# Altium footprint library kalios.PcbLib: 404 footprints (part 20 of 26)
Each footprint in its own frame and in the unit in brackets; x right, y up, seen from the top. Pads: shape width x height; smd on the part's side, far side on the other; paste and mask are expansions set on the pad; w line width, h text height; cw(c..) or ccw(c..) is an arc to the next point about the centre after c.
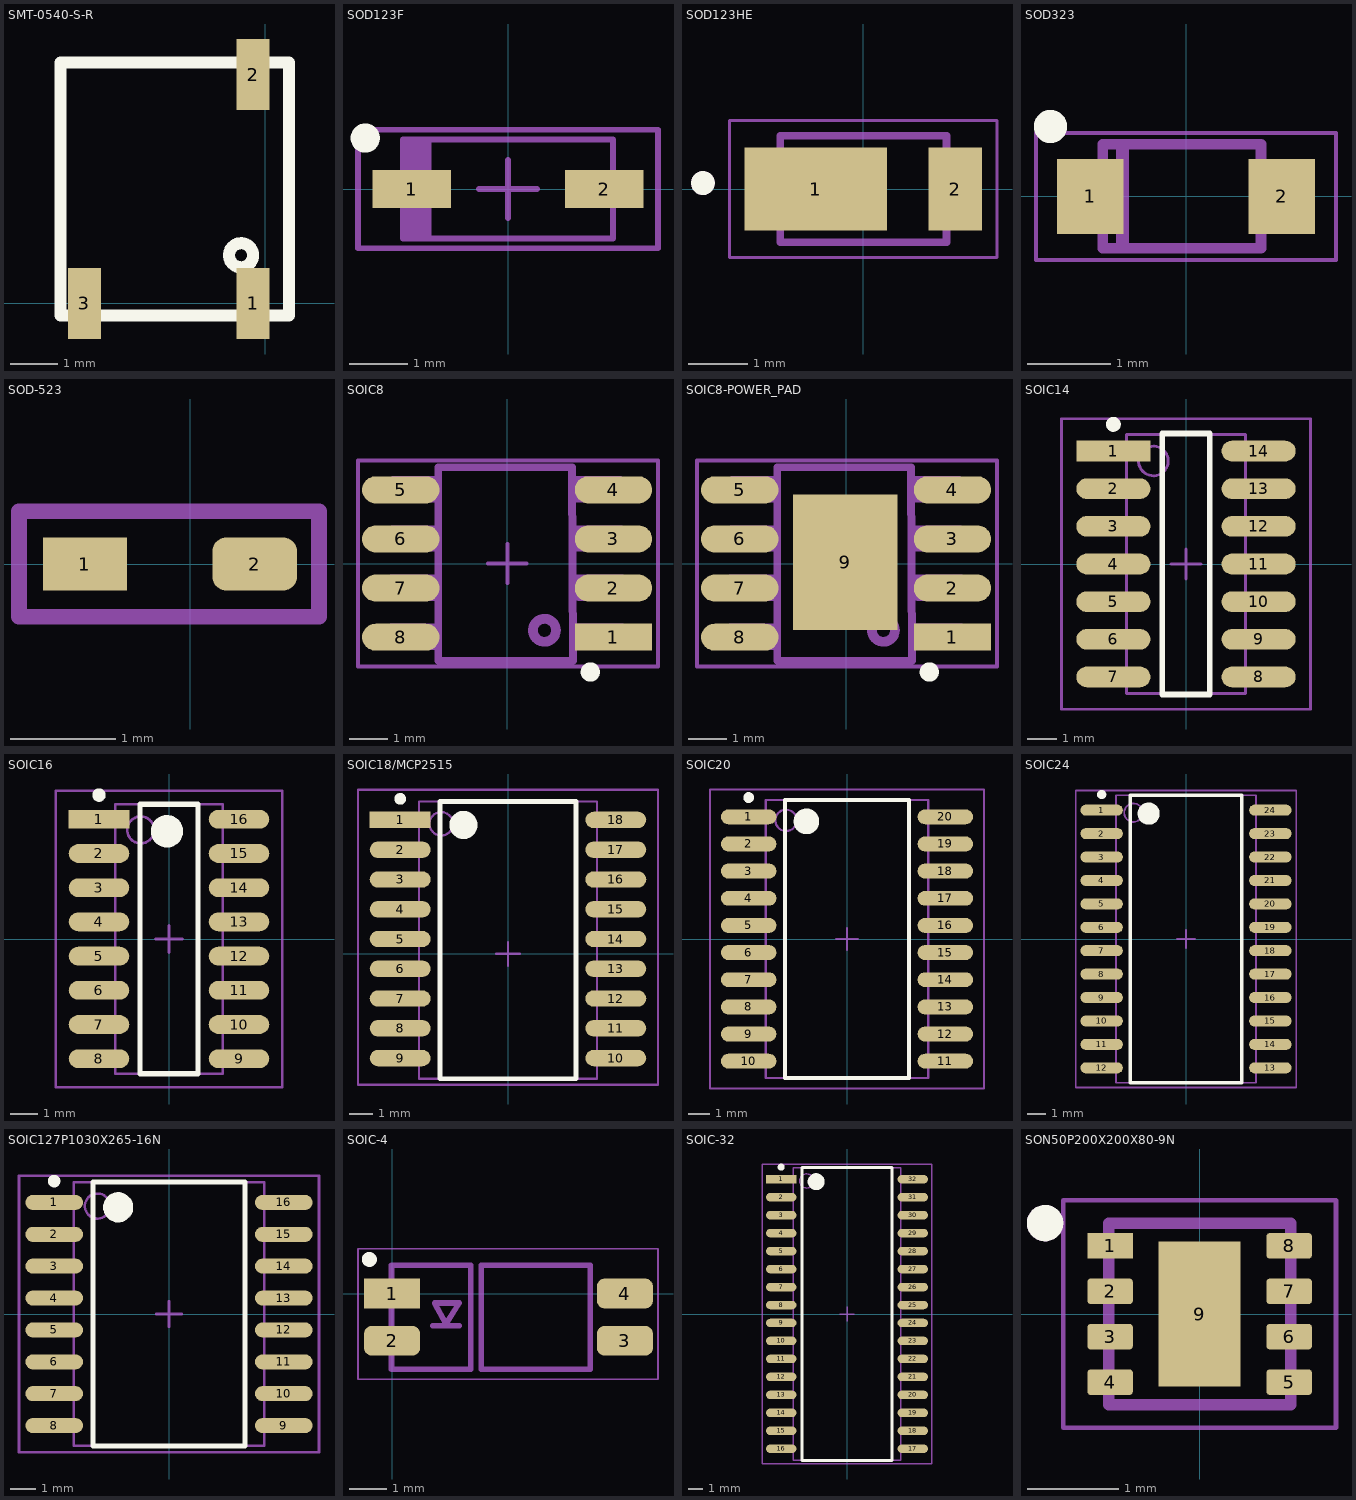
[diagram p19: the footprints below, top view; thin cyan lines are the x and y axes]

## SMT-0540-S-R [mm]
height 2.5
pads (3):
  rect 0.7x1.5 smd: 1(-0.254,0) 2(-0.254,4.826) 3(-3.81,0)
Top Overlay:
  circle w0.254: c-0.508,1.016 r0.254
  lines w0.254: -4.318,-0.254 0.508,-0.254 0.508,5.08 -4.318,5.08 -4.318,-0.254
Top Designator:
  text ".Designator" at -9.523,1.905 h1.52
3D body "SMT-0540-S-R.STEP": height 2, standoff 0, extent -4.38,-0.33 0.62,5.17

## SOD123F [mm] "Molded Diode, 2-Leads, Body 3.5x1.6mm, IPC Medium Density"
height 1.2
pads (2):
  rect 1.35x0.65 smd: 1(-1.65,0) 2(1.65,0)
Top Overlay:
  circle w0.25: c-2.45,0.875 r0.125
Top 3D Body:
  rectangle: -1.8,-0.85 -1.316,0.85
  lines w0.1: -1.8,-0.85 1.8,-0.85 1.8,0.85 -1.8,0.85 -1.8,-0.85
Top Courtyard:
  lines w0.1: -0.5,0 0.5,0 ; 0,-0.5 0,0.5 ; -2.575,-1.016 2.575,-1.016 2.575,1.016 -2.575,1.016 -2.575,-1.016
Top Designator:
  text ".Designator" at -3.536,-0.233 h0.7
3D body "SOD123F.STEP": height 1.27, standoff 0, extent -1.876,-0.8 1.824,0.8

## SOD123HE [mm]
pads (2):
  rect 2.4x1.4 smd: 1(-0.8,0)
  rect 0.9x1.4 smd: 2(1.55,0)
Top Overlay:
  circle w0.2: c-2.7,0.1 r0.1
Top 3D Body:
  circle w0.2: c-2.7,0.1 r0.1
  lines w0.127: -1.4,-0.9 -1.4,0.9 1.4,0.9 1.4,-0.9 -1.4,-0.9
Top Courtyard:
  lines w0.05: -2.25,-1.15 -2.25,1.15 2.25,1.15 2.25,-1.15 -2.25,-1.15
3D body "step_temp.STEP": height 0.85, standoff 0, extent -1.85,-0.9 1.85,0.9

## SOD323 [mm]
pads (2):
  rect 0.8x0.9 smd: 1(-1.15,0) 2(1.15,0)
Top Overlay:
  circle w0.2: c-1.626,0.838 r0.1
Top 3D Body:
  lines w0.127: -1,-0.625 -1,0.625 0.9,0.625 0.9,-0.625 -1,-0.625
  lines w0.152: -0.762,-0.61 -0.762,0.584
Top Courtyard:
  lines w0.05: -1.8,-0.762 1.8,-0.762 1.8,0.762 -1.8,0.762 -1.8,-0.762
Top Designator:
  text ".Designator" at -2.737,-0.167 h0.5
3D body "User Library-SOD323F-1.step": height 1, standoff 0, extent -1.25,-0.675 1.25,0.675

## SOD-523 [mm]
pads (2):
  rect 0.8x0.5 smd: 1(-1,0)
  rrect50% 0.8x0.5 smd: 2(0.61,0)
Top Dimensions:
  lines w0.15: -1.626,-0.5 1.219,-0.5 1.219,0.5 -1.626,0.5 -1.626,0.074 -1.626,-0.5
Top Designator:
  text ".Designator" at -7.821,-0.508 h1.52
3D body "SOD-523.STEP": height 0.71, standoff 0, extent -1.029,-0.457 0.673,0.432

## SOIC8 [mm] "8-Pin Small Outline Integrated Circuit 1.27 mm Pitch, IPC Low Density"
height 1.75
pads (8):
  rect 2x0.7 smd: 1(2.749,-1.905)
  oval 2x0.7 smd: 2(2.749,-0.635) 3(2.749,0.635) 4(2.749,1.905) 5(-2.749,1.905) 6(-2.749,0.635) 7(-2.749,-0.635) 8(-2.749,-1.905)
Top Overlay:
  circle w0.25: c2.151,-2.805 r0.125
Top 3D Body:
  circle w0.254: c0.965,-1.727 r0.297
  lines w0.2: -2.565,-2.083 -2.565,-1.651 ; -2.565,-0.813 -2.565,-0.381 ; -2.54,0.457 -2.54,0.889 ; -2.515,1.727 -2.515,2.159 ; -1.88,-2.134 -2.997,-2.134 -2.997,-1.651 -1.829,-1.651 ; -1.88,-0.864 -2.997,-0.864 -2.997,-0.381 -1.829,-0.381 ; -1.854,0.406 -2.972,0.406 -2.972,0.889 -1.803,0.889 ; -1.829,1.676 -2.946,1.676 -2.946,2.159 -1.778,2.159 ; -1.778,2.489 -1.778,-2.515 1.702,-2.515 1.676,2.489 -1.753,2.489 ; 1.753,2.159 2.921,2.159 2.921,1.676 1.803,1.676 ; 1.778,0.889 2.946,0.889 2.946,0.406 1.829,0.406 ; 1.803,-1.651 2.972,-1.651 2.972,-2.134 1.854,-2.134 ; 1.803,-0.381 2.972,-0.381 2.972,-0.864 1.854,-0.864 ; 2.489,1.727 2.489,2.159 ; 2.515,0.457 2.515,0.889 ; 2.54,-2.083 2.54,-1.651 ; 2.54,-0.813 2.54,-0.381
Top Courtyard:
  lines w0.1: -0.494,0 0.506,0 ; 0.006,-0.5 0.006,0.5 ; -3.855,-2.667 3.901,-2.667 3.901,2.667 -3.855,2.667 -3.855,-2.667
Top Designator:
  text ".Designator" at -7.595,-0.677 h1.52
3D body "SOIC-8.STEP": height 1.75, standoff 0, extent -2.966,-2.5 3.045,2.5

## SOIC8-POWER_PAD [mm] "8-Pin Small Outline Integrated Circuit 1.27 mm Pitch, IPC Low Density"
height 1.75
pads (9):
  rect 2x0.7 smd: 1(2.749,-1.905)
  oval 2x0.7 smd: 2(2.749,-0.635) 3(2.749,0.635) 4(2.749,1.905) 5(-2.749,1.905) 6(-2.749,0.635) 7(-2.749,-0.635) 8(-2.749,-1.905)
  rect 2.7x3.5 smd paste-1.6: 9(-0.027,0.031)
Top Overlay:
  circle w0.25: c2.151,-2.805 r0.125
Top 3D Body:
  circle w0.254: c0.965,-1.727 r0.297
  lines w0.2: -2.565,-2.083 -2.565,-1.651 ; -2.565,-0.813 -2.565,-0.381 ; -2.54,0.457 -2.54,0.889 ; -2.515,1.727 -2.515,2.159 ; -1.88,-2.134 -2.997,-2.134 -2.997,-1.651 -1.829,-1.651 ; -1.88,-0.864 -2.997,-0.864 -2.997,-0.381 -1.829,-0.381 ; -1.854,0.406 -2.972,0.406 -2.972,0.889 -1.803,0.889 ; -1.829,1.676 -2.946,1.676 -2.946,2.159 -1.778,2.159 ; -1.778,2.489 -1.778,-2.515 1.702,-2.515 1.676,2.489 -1.753,2.489 ; 1.753,2.159 2.921,2.159 2.921,1.676 1.803,1.676 ; 1.778,0.889 2.946,0.889 2.946,0.406 1.829,0.406 ; 1.803,-1.651 2.972,-1.651 2.972,-2.134 1.854,-2.134 ; 1.803,-0.381 2.972,-0.381 2.972,-0.864 1.854,-0.864 ; 2.489,1.727 2.489,2.159 ; 2.515,0.457 2.515,0.889 ; 2.54,-2.083 2.54,-1.651 ; 2.54,-0.813 2.54,-0.381
Top Courtyard:
  lines w0.1: -0.494,0 0.506,0 ; 0.006,-0.5 0.006,0.5 ; -3.855,-2.667 -3.855,2.667 3.901,2.667 3.901,-2.667 -3.855,-2.667
Top Designator:
  text ".Designator" at -3.476,-0.402 h0.7
3D body "SOIC-8.STEP": height 1.75, standoff 0, extent -2.966,-2.5 3.046,2.5

## SOIC14 [mm] "14-Pin Small Outline Integrated Circuit 1.27 mm Pitch, IPC Low Density"
height 1.75
pads (14):
  rect 2.5x0.7 smd: 1(-2.45,3.81)
  oval 2.5x0.7 smd: 2(-2.45,2.54) 3(-2.45,1.27) 4(-2.45,0) 5(-2.45,-1.27) 6(-2.45,-2.54) 7(-2.45,-3.81) 8(2.45,-3.81) 9(2.45,-2.54) 10(2.45,-1.27) 11(2.45,0) 12(2.45,1.27) 13(2.45,2.54) 14(2.45,3.81)
Top Overlay:
  circle w0.25: c-2.45,4.71 r0.125
  lines w0.2: -0.8,-4.4 0.8,-4.4 0.8,4.4 -0.8,4.4 -0.8,-4.4
Top 3D Body:
  circle w0.1: c-1.1,3.475 r0.5
  lines w0.1: -2,-4.375 2,-4.375 2,4.375 -2,4.375 -2,-4.375
Top Courtyard:
  lines w0.1: -0.5,0 0.5,0 ; 0,-0.5 0,0.5 ; -4.2,-4.9 4.2,-4.9 4.2,4.9 -4.2,4.9 -4.2,-4.9
Top Designator:
  text ".Designator" at -7.618,-0.503 h1.52
3D body "SOIC14.STEP": height 1.75, standoff 0, extent -3.05,-4.375 3.15,4.375

## SOIC16 [mm] "SOIC, 16-Leads, Body 10.0x4.0mm (max), Pitch 1.27mm, IPC Low Density"
height 1.2
pads (16):
  rect 2.25x0.7 smd: 1(-2.6,4.445)
  oval 2.25x0.7 smd: 2(-2.6,3.175) 3(-2.6,1.905) 4(-2.6,0.635) 5(-2.6,-0.635) 6(-2.6,-1.905) 7(-2.6,-3.175) 8(-2.6,-4.445) 9(2.6,-4.445) 10(2.6,-3.175) 11(2.6,-1.905) 12(2.6,-0.635) 13(2.6,0.635) 14(2.6,1.905) 15(2.6,3.175) 16(2.6,4.445)
Top Overlay:
  circle w0.25: c-2.6,5.345 r0.125
  circle w0.6: c-0.075,4 r0.3
  lines w0.2: -1.075,-5 -1.075,5 1.075,5 1.075,-5 -1.075,-5
Top 3D Body:
  circle w0.1: c-1.05,4.05 r0.5
  lines w0.1: -2,-5 -2,5 2,5 2,-5 -2,-5
Top Courtyard:
  lines w0.1: -0.5,0 0.5,0 ; 0,-0.5 0,0.5 ; -4.2,-5.5 -4.2,5.5 4.2,5.5 4.2,-5.5 -4.2,-5.5
Top Designator:
  text ".Designator" at -7.618,-0.485 h1.52
3D body "User Library-SOIC16-150.STEP": height 1.75, standoff 0, extent -2.976,-4.872 2.824,4.928

## SOIC18/MCP2515 [mm] "SOIC, 18-Leads, Body 9.4 Pitch 1.27mm, IPC Low Density"
height 2.65
pads (18):
  rect 2.6x0.7 smd: 1(-4.6,5.715)
  oval 2.6x0.7 smd: 2(-4.6,4.445) 3(-4.6,3.175) 4(-4.6,1.905) 5(-4.6,0.635) 6(-4.6,-0.635) 7(-4.6,-1.905) 8(-4.6,-3.175) 9(-4.6,-4.445) 10(4.6,-4.445) 11(4.6,-3.175) 12(4.6,-1.905) 13(4.6,-0.635) 14(4.6,0.635) 15(4.6,1.905) 16(4.6,3.175) 17(4.6,4.445) 18(4.6,5.715)
Top Overlay:
  circle w0.6: c-1.9,5.5 r0.3
  circle w0.25: c-4.6,6.615 r0.125
  lines w0.2: -2.9,-5.334 2.9,-5.334 2.9,6.5 -2.9,6.5 -2.9,-5.334
Top 3D Body:
  circle w0.1: c-2.85,5.55 r0.5
  lines w0.1: -3.8,-5.334 3.8,-5.334 3.8,6.5 -3.8,6.5 -3.8,-5.334
Top Courtyard:
  lines w0.1: -0.5,0 0.5,0 ; 0,-0.5 0,0.5 ; -6.4,-5.588 6.4,-5.588 6.4,7 -6.4,7 -6.4,-5.588
Top Designator:
  text ".Designator" at -7.618,0.198 h1.52
3D body "User Library-MCP2515 SOIC-18.STEP": height 2.48, standoff -0.01, extent -5.219,-5.115 5.321,6.385

## SOIC20 [mm] "SOIC, 20-Leads, Body 13.0x7.6mm (max), Pitch 1.27mm, IPC Low Density"
height 2.65
pads (20):
  oval 2.6x0.7 smd: 1(-4.6,5.715) 2(-4.6,4.445) 3(-4.6,3.175) 4(-4.6,1.905) 5(-4.6,0.635) 6(-4.6,-0.635) 7(-4.6,-1.905) 8(-4.6,-3.175) 9(-4.6,-4.445) 10(-4.6,-5.715) 11(4.6,-5.715) 12(4.6,-4.445) 13(4.6,-3.175) 14(4.6,-1.905) 15(4.6,-0.635) 16(4.6,0.635) 17(4.6,1.905) 18(4.6,3.175) 19(4.6,4.445) 20(4.6,5.715)
Top Overlay:
  circle w0.25: c-4.6,6.615 r0.125
  circle w0.6: c-1.9,5.5 r0.3
  lines w0.2: -2.9,-6.5 -2.9,6.5 2.9,6.5 2.9,-6.5 -2.9,-6.5
Top 3D Body:
  circle w0.1: c-2.85,5.55 r0.5
  lines w0.1: -3.8,-6.5 -3.8,6.5 3.8,6.5 3.8,-6.5 -3.8,-6.5
Top Courtyard:
  lines w0.1: -0.5,0 0.5,0 ; 0,-0.5 0,0.5 ; -6.4,-7 -6.4,7 6.4,7 6.4,-7 -6.4,-7
Top Designator:
  text ".Designator" at -7.618,-0.508 h1.52
3D body "User Library-SOIC20-300.STEP": height 2.65, standoff 0, extent -5.099,-6.425 5.201,6.375

## SOIC24 [mm] "SOIC, 24-Leads, Body 15.6x7.6mm (max), Pitch 1.27mm, IPC Medium Density"
height 2.65
pads (24):
  oval 2.3x0.6 smd: 1(-4.575,6.985) 2(-4.575,5.715) 3(-4.575,4.445) 4(-4.575,3.175) 5(-4.575,1.905) 6(-4.575,0.635) 7(-4.575,-0.635) 8(-4.575,-1.905) 9(-4.575,-3.175) 10(-4.575,-4.445) 11(-4.575,-5.715) 12(-4.575,-6.985) 13(4.575,-6.985) 14(4.575,-5.715) 15(4.575,-4.445) 16(4.575,-3.175) 17(4.575,-1.905) 18(4.575,-0.635) 19(4.575,0.635) 20(4.575,1.905) 21(4.575,3.175) 22(4.575,4.445) 23(4.575,5.715) 24(4.575,6.985)
Top Overlay:
  circle w0.25: c-4.575,7.835 r0.125
  circle w0.6: c-2.025,6.8 r0.3
  lines w0.2: -3.025,-7.8 -3.025,7.8 3.025,7.8 3.025,-7.8 -3.025,-7.8
Top 3D Body:
  circle w0.1: c-2.85,6.85 r0.5
  lines w0.1: -3.8,-7.8 -3.8,7.8 3.8,7.8 3.8,-7.8 -3.8,-7.8
Top Courtyard:
  lines w0.1: -0.5,0 0.5,0 ; 0,-0.5 0,0.5 ; -5.975,-8.05 -5.975,8.05 5.975,8.05 5.975,-8.05 -5.975,-8.05
Top Designator:
  text ".Designator" at -7.618,-0.508 h1.52
3D body "User Library-SOIC24-300.STEP": height 2.65, standoff 0, extent -5.15,-7.7 5.15,7.8

## SOIC127P1030X265-16N [mm] "SOIC, 16-Leads, Body 10.5x7.6mm (max), Pitch 1.27mm, IPC Medium Density"
height 2.65
pads (16):
  oval 2.3x0.6 smd: 1(-4.575,4.445) 2(-4.575,3.175) 3(-4.575,1.905) 4(-4.575,0.635) 5(-4.575,-0.635) 6(-4.575,-1.905) 7(-4.575,-3.175) 8(-4.575,-4.445) 9(4.575,-4.445) 10(4.575,-3.175) 11(4.575,-1.905) 12(4.575,-0.635) 13(4.575,0.635) 14(4.575,1.905) 15(4.575,3.175) 16(4.575,4.445)
Top Overlay:
  circle w0.25: c-4.575,5.295 r0.125
  circle w0.6: c-2.025,4.25 r0.3
  lines w0.2: -3.025,-5.25 -3.025,5.25 3.025,5.25 3.025,-5.25 -3.025,-5.25
Top 3D Body:
  circle w0.1: c-2.85,4.3 r0.5
  lines w0.1: -3.8,-5.25 -3.8,5.25 3.8,5.25 3.8,-5.25 -3.8,-5.25
Top Courtyard:
  lines w0.1: -0.5,0 0.5,0 ; 0,-0.5 0,0.5 ; -5.975,-5.5 -5.975,5.5 5.975,5.5 5.975,-5.5 -5.975,-5.5
Top Designator:
  text ".Designator" at -7.618,-0.508 h1.52
3D body "User Library-IPC SO.STEP": height 2.8, standoff 0, extent -5.178,-5.3 5.178,5.2

## SOIC-4 [mm]
pads (4):
  rect 1.5x0.8 smd: 1(0,0)
  rrect50% 1.5x0.8 smd: 2(0,-1.27) 3(6.25,-1.27) 4(6.25,0)
Top Overlay:
  circle w0.2: c-0.61,0.914 r0.1
Top 3D Body:
  lines w0.152: 1.092,-0.864 1.803,-0.864 ; -0.017,-2.032 2.11,-2.032 2.11,-1.925 2.11,0.762 -0.017,0.762 -0.017,-2.032 ; 1.143,-0.254 1.448,-0.813 1.803,-0.254 1.143,-0.254 ; 2.396,-2.032 2.396,0.762 5.317,0.762 5.317,-2.032 2.396,-2.032
Top Courtyard:
  lines w0.05: -0.914,-2.3 7.137,-2.3 7.137,1.2 -0.914,1.2 -0.914,-2.3
3D body "SOIC-4.STEP": height 2.1, standoff 0.01, extent -0.401,-1.935 6.599,0.665

## SOIC-32 [mm] "SOIC, 32-Leads, Body 20.7x7.6mm (max), Pitch 1.27mm, IPC Medium Density"
height 2.65
pads (32):
  rect 2.15x0.6 smd: 1(-4.65,9.525)
  oval 2.15x0.6 smd: 2(-4.65,8.255) 3(-4.65,6.985) 4(-4.65,5.715) 5(-4.65,4.445) 6(-4.65,3.175) 7(-4.65,1.905) 8(-4.65,0.635) 9(-4.65,-0.635) 10(-4.65,-1.905) 11(-4.65,-3.175) 12(-4.65,-4.445) 13(-4.65,-5.715) 14(-4.65,-6.985) 15(-4.65,-8.255) 16(-4.65,-9.525) 17(4.65,-9.525) 18(4.65,-8.255) 19(4.65,-6.985) 20(4.65,-5.715) 21(4.65,-4.445) 22(4.65,-3.175) 23(4.65,-1.905) 24(4.65,-0.635) 25(4.65,0.635) 26(4.65,1.905) 27(4.65,3.175) 28(4.65,4.445) 29(4.65,5.715) 30(4.65,6.985) 31(4.65,8.255) 32(4.65,9.525)
Top Overlay:
  circle w0.25: c-4.65,10.375 r0.125
  circle w0.6: c-2.175,9.35 r0.3
  lines w0.2: -3.175,-10.35 -3.175,10.35 3.175,10.35 3.175,-10.35 -3.175,-10.35
Top 3D Body:
  circle w0.1: c-2.85,9.4 r0.5
  lines w0.1: -3.8,-10.35 -3.8,10.35 3.8,10.35 3.8,-10.35 -3.8,-10.35
Top Courtyard:
  lines w0.1: -0.5,0 0.5,0 ; 0,-0.5 0,0.5 ; -5.975,-10.6 -5.975,10.6 5.975,10.6 5.975,-10.6 -5.975,-10.6
Top Designator:
  text ".Designator" at -7.618,-0.508 h1.52
3D body "so32.STEP": height 2.85, standoff 0.05, extent -5.105,-10.452 5.172,10.338

## SON50P200X200X80-9N [mm]
pads (9):
  rect 0.5x0.28 smd: 1(-0.985,0.75)
  rrect25% 0.5x0.28 smd: 2(-0.985,0.25) 3(-0.985,-0.25) 4(-0.985,-0.75) 5(0.985,-0.75) 6(0.985,-0.25) 7(0.985,0.25) 8(0.985,0.75)
  rect 0.9x1.6 smd paste-2: 9(0,0)
Top Overlay:
  circle w0.2: c-1.7,1 r0.1
Top Paste:
  region: 0.28,-0.51 -0.28,-0.51 -0.28,0.51 0.28,0.51
Top 3D Body:
  circle w0.2: c-1.7,1 r0.1
  lines w0.127: -1,-1 -1,1 1,1 1,-1 -1,-1
Top Courtyard:
  lines w0.05: -1.5,-1.25 -1.5,1.25 1.5,1.25 1.5,-1.25 -1.5,-1.25
Top Designator:
  text ".Designator" at -3.746,-0.233 h0.7
3D body "INA381A4IDSGR.STEP": height 0.8, standoff 0, extent -1,-1 1,1